# Altium footprint library 691 310 340 0xx.PcbLib: 23 footprints (part 1 of 2)
Each footprint in its own frame and in the unit in brackets; x right, y up, seen from the top. Pads: shape width x height; smd on the part's side, far side on the other; paste and mask are expansions set on the pad; w line width, h text height; cw(c..) or ccw(c..) is an arc to the next point about the centre after c.
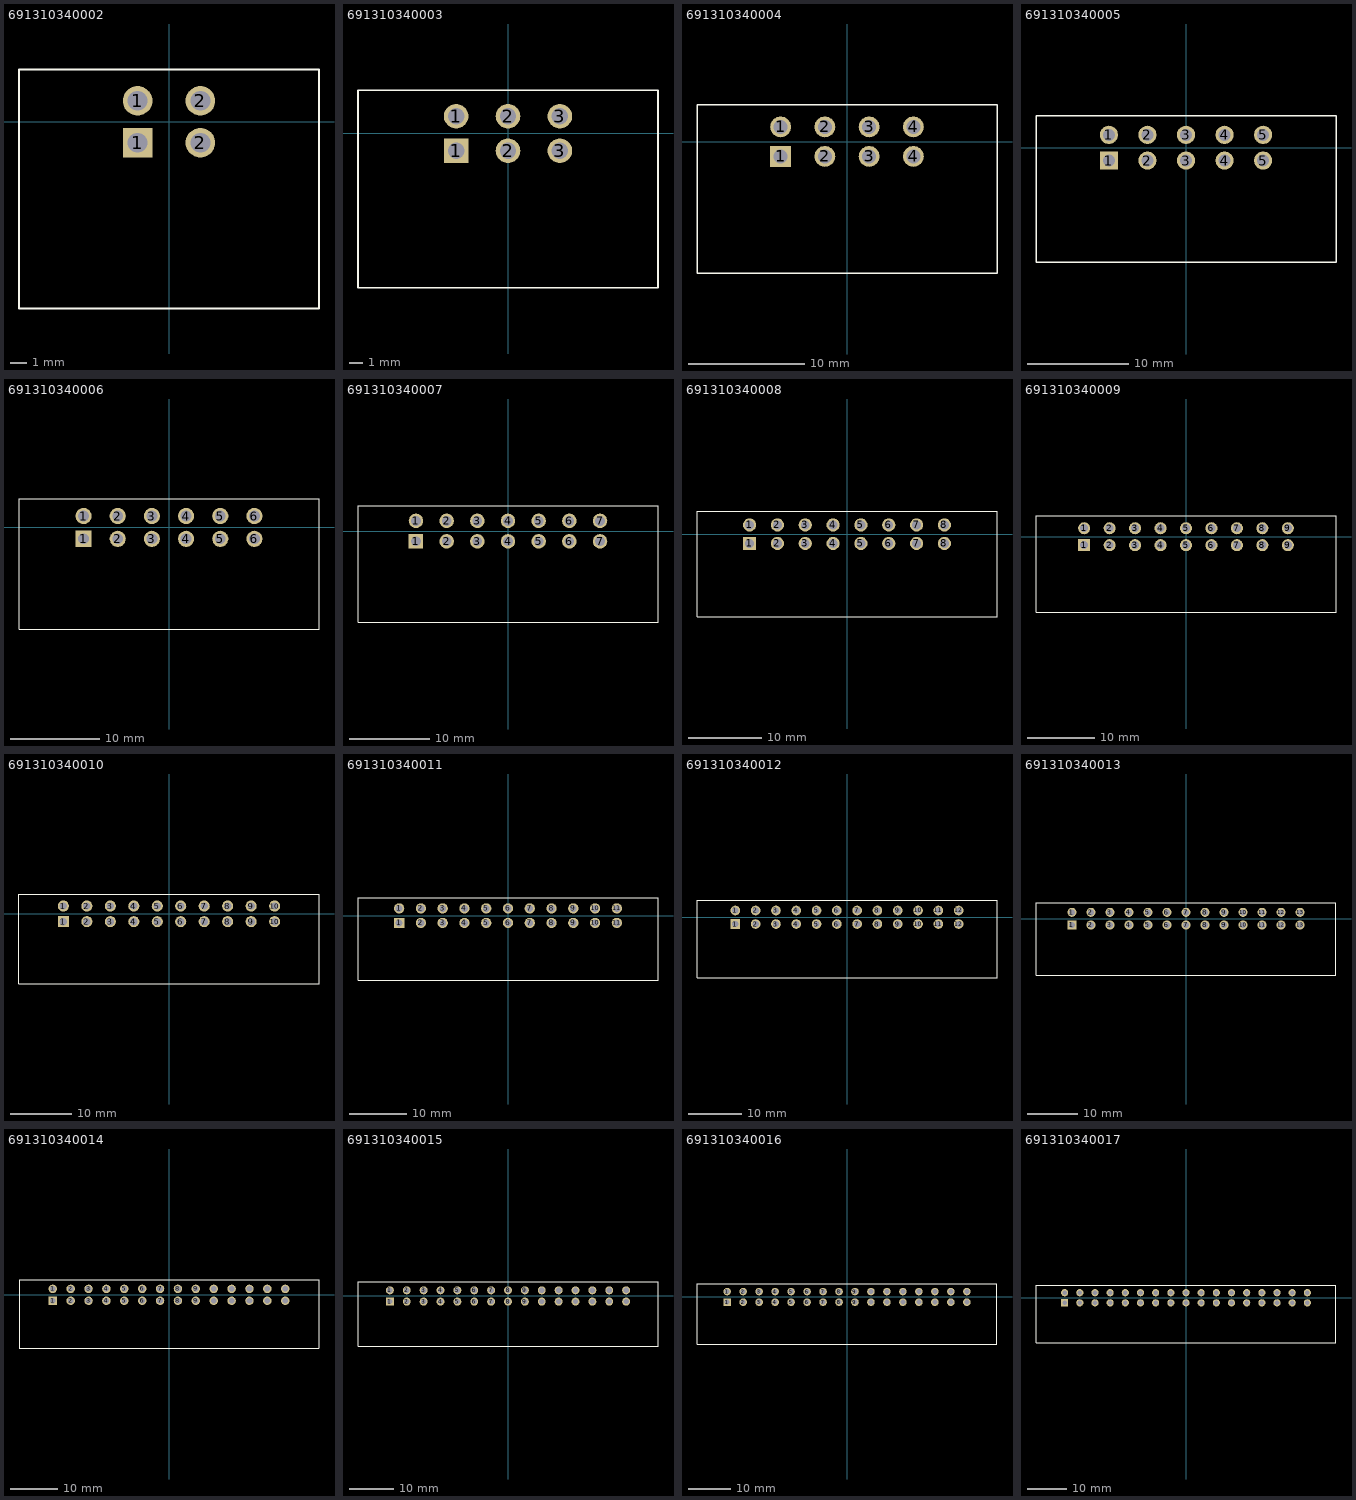
[diagram p0: the footprints below, top view; thin cyan lines are the x and y axes]

## 691310340002 [mm] "Serie 3103 - 3.81 mm _ 2 pins"
height 6.8
pads (4):
  rect 1.8x1.8 hole 1.2: 1(-1.905,-1.27)
  round 1.8 hole 1.2: 1(-1.905,1.27) 2(1.905,-1.27) 2(1.905,1.27)
Top Overlay:
  lines w0.127: -9.105,-11.33 9.105,-11.33 9.105,3.17 -9.105,3.17 -9.105,-11.33
3D body: height 6.9, standoff -3.3, extent -9.105,-11.3 9.105,3.2

## 691310340003 [mm] "Serie 3103 - 3.81 mm _ 3 pins"
height 6.8
pads (6):
  rect 1.8x1.8 hole 1.2: 1(-3.81,-1.27)
  round 1.8 hole 1.2: 1(-3.81,1.27) 2(0,-1.27) 2(0,1.27) 3(3.81,-1.27) 3(3.81,1.27)
Top Overlay:
  lines w0.127: -11.01,-11.33 11.01,-11.33 11.01,3.17 -11.01,3.17 -11.01,-11.33
3D body: height 6.9, standoff -3.3, extent -11,-11.3 11.02,3.2

## 691310340004 [mm] "Serie 3103 - 3.81 mm _ 4 pins"
height 6.8
pads (8):
  rect 1.8x1.8 hole 1.2: 1(-5.715,-1.27)
  round 1.8 hole 1.2: 1(-5.715,1.27) 2(-1.905,-1.27) 2(-1.905,1.27) 3(1.905,-1.27) 3(1.905,1.27) 4(5.715,-1.27) 4(5.715,1.27)
Top Overlay:
  lines w0.127: -12.915,-11.33 12.915,-11.33 12.915,3.17 -12.915,3.17 -12.915,-11.33
3D body: height 6.9, standoff -3.3, extent -12.9,-11.3 12.93,3.2

## 691310340005 [mm] "Serie 3103 - 3.81 mm _ 5 pins"
height 6.8
pads (10):
  rect 1.8x1.8 hole 1.2: 1(-7.62,-1.27)
  round 1.8 hole 1.2: 1(-7.62,1.27) 2(-3.81,-1.27) 2(-3.81,1.27) 3(0,-1.27) 3(0,1.27) 4(3.81,-1.27) 4(3.81,1.27) 5(7.62,-1.27) 5(7.62,1.27)
Top Overlay:
  lines w0.127: -14.82,-11.33 -14.82,3.17 14.82,3.17 14.82,-11.33 -14.82,-11.33
3D body: height 6.9, standoff -3.3, extent -14.8,-11.3 14.84,3.2

## 691310340006 [mm] "Serie 3103 - 3.81 mm _ 6 pins"
height 6.8
pads (12):
  rect 1.8x1.8 hole 1.2: 1(-9.525,-1.27)
  round 1.8 hole 1.2: 1(-9.525,1.27) 2(-5.715,-1.27) 2(-5.715,1.27) 3(-1.905,-1.27) 3(-1.905,1.27) 4(1.905,-1.27) 4(1.905,1.27) 5(5.715,-1.27) 5(5.715,1.27) 6(9.525,-1.27) 6(9.525,1.27)
Top Overlay:
  lines w0.127: -16.725,-11.33 16.725,-11.33 16.725,3.17 -16.725,3.17 -16.725,-11.33
3D body: height 6.9, standoff -3.3, extent -16.7,-11.3 16.75,3.2

## 691310340007 [mm] "Serie 3103 - 3.81 mm _ 7 pins"
height 6.8
pads (14):
  rect 1.8x1.8 hole 1.2: 1(-11.43,-1.27)
  round 1.8 hole 1.2: 1(-11.43,1.27) 2(-7.62,-1.27) 2(-7.62,1.27) 3(-3.81,-1.27) 3(-3.81,1.27) 4(0,-1.27) 4(0,1.27) 5(3.81,-1.27) 5(3.81,1.27) 6(7.62,-1.27) 6(7.62,1.27) 7(11.43,-1.27) 7(11.43,1.27)
Top Overlay:
  lines w0.127: -18.63,-11.33 -18.63,3.17 18.63,3.17 18.63,-11.33 -18.63,-11.33
3D body: height 6.9, standoff -3.3, extent -18.6,-11.3 18.66,3.2

## 691310340008 [mm] "Serie 3103 - 3.81 mm _ 8 pins"
height 6.8
pads (16):
  rect 1.8x1.8 hole 1.2: 1(-13.335,-1.27)
  round 1.8 hole 1.2: 1(-13.335,1.27) 2(-9.525,-1.27) 2(-9.525,1.27) 3(-5.715,-1.27) 3(-5.715,1.27) 4(-1.905,-1.27) 4(-1.905,1.27) 5(1.905,-1.27) 5(1.905,1.27) 6(5.715,-1.27) 6(5.715,1.27) 7(9.525,-1.27) 7(9.525,1.27) 8(13.335,-1.27) 8(13.335,1.27)
Top Overlay:
  lines w0.127: -20.535,-11.33 20.535,-11.33 20.535,3.17 -20.535,3.17 -20.535,-11.33
3D body: height 6.9, standoff -3.3, extent -20.47,-11.4 20.6,3.1

## 691310340009 [mm] "Serie 3103 - 3.81 mm _ 9 pins"
height 6.8
pads (18):
  rect 1.8x1.8 hole 1.2: 1(-15.24,-1.27)
  round 1.8 hole 1.2: 1(-15.24,1.27) 2(-11.43,-1.27) 2(-11.43,1.27) 3(-7.62,-1.27) 3(-7.62,1.27) 4(-3.81,-1.27) 4(-3.81,1.27) 5(0,-1.27) 5(0,1.27) 6(3.81,-1.27) 6(3.81,1.27) 7(7.62,-1.27) 7(7.62,1.27) 8(11.43,-1.27) 8(11.43,1.27) 9(15.24,-1.27) 9(15.24,1.27)
Top Overlay:
  lines w0.127: -22.44,-11.33 22.44,-11.33 22.44,3.17 -22.44,3.17 -22.44,-11.33
3D body: height 6.9, standoff -3.3, extent -22.48,-11.3 22.4,3.2

## 691310340010 [mm] "Serie 3103 - 3.81 mm _ 10 pins"
height 6.8
pads (20):
  rect 1.8x1.8 hole 1.2: 1(-17.145,-1.27)
  round 1.8 hole 1.2: 1(-17.145,1.27) 2(-13.335,-1.27) 2(-13.335,1.27) 3(-9.525,-1.27) 3(-9.525,1.27) 4(-5.715,-1.27) 4(-5.715,1.27) 5(-1.905,-1.27) 5(-1.905,1.27) 6(1.905,-1.27) 6(1.905,1.27) 7(5.715,-1.27) 7(5.715,1.27) 8(9.525,-1.27) 8(9.525,1.27) 9(13.335,-1.27) 9(13.335,1.27) 10(17.145,-1.27) 10(17.145,1.27)
Top Overlay:
  lines w0.127: -24.345,-11.33 24.345,-11.33 24.345,3.17 -24.345,3.17 -24.345,-11.33
3D body: height 6.9, standoff -3.3, extent -24.4,-11.3 24.29,3.2

## 691310340011 [mm] "Serie 3103 - 3.81 mm _ 11 pins"
height 6.8
pads (22):
  rect 1.8x1.8 hole 1.2: 1(-19.05,-1.27)
  round 1.8 hole 1.2: 1(-19.05,1.27) 2(-15.24,-1.27) 2(-15.24,1.27) 3(-11.43,-1.27) 3(-11.43,1.27) 4(-7.62,-1.27) 4(-7.62,1.27) 5(-3.81,-1.27) 5(-3.81,1.27) 6(0,-1.27) 6(0,1.27) 7(3.81,-1.27) 7(3.81,1.27) 8(7.62,-1.27) 8(7.62,1.27) 9(11.43,-1.27) 9(11.43,1.27) 10(15.24,-1.27) 10(15.24,1.27) 11(19.05,-1.27) 11(19.05,1.27)
Top Overlay:
  lines w0.127: -26.25,-11.33 26.25,-11.33 26.25,3.17 -26.25,3.17 -26.25,-11.33
3D body: height 6.9, standoff -3.3, extent -26.3,-11.3 26.2,3.2

## 691310340012 [mm] "Serie 3103 - 3.81 mm _ 12 pins"
height 6.8
pads (24):
  rect 1.8x1.8 hole 1.2: 1(-20.955,-1.27)
  round 1.8 hole 1.2: 1(-20.955,1.27) 2(-17.145,-1.27) 2(-17.145,1.27) 3(-13.335,-1.27) 3(-13.335,1.27) 4(-9.525,-1.27) 4(-9.525,1.27) 5(-5.715,-1.27) 5(-5.715,1.27) 6(-1.905,-1.27) 6(-1.905,1.27) 7(1.905,-1.27) 7(1.905,1.27) 8(5.715,-1.27) 8(5.715,1.27) 9(9.525,-1.27) 9(9.525,1.27) 10(13.335,-1.27) 10(13.335,1.27) 11(17.145,-1.27) 11(17.145,1.27) 12(20.955,-1.27) 12(20.955,1.27)
Top Overlay:
  lines w0.127: -28.155,-11.33 -28.155,3.17 28.155,3.17 28.155,-11.33 -28.155,-11.33
3D body: height 6.9, standoff -3.3, extent -28.1,-11.4 28.21,3.1

## 691310340013 [mm] "Serie 3103 - 3.81 mm _ 13 pins"
height 6.8
pads (26):
  rect 1.8x1.8 hole 1.2: 1(-22.86,-1.27)
  round 1.8 hole 1.2: 1(-22.86,1.27) 2(-19.05,-1.27) 2(-19.05,1.27) 3(-15.24,-1.27) 3(-15.24,1.27) 4(-11.43,-1.27) 4(-11.43,1.27) 5(-7.62,-1.27) 5(-7.62,1.27) 6(-3.81,-1.27) 6(-3.81,1.27) 7(0,-1.27) 7(0,1.27) 8(3.81,-1.27) 8(3.81,1.27) 9(7.62,-1.27) 9(7.62,1.27) 10(11.43,-1.27) 10(11.43,1.27) 11(15.24,-1.27) 11(15.24,1.27) 12(19.05,-1.27) 12(19.05,1.27) 13(22.86,-1.27) 13(22.86,1.27)
Top Overlay:
  lines w0.127: -30.06,-11.33 -30.06,3.17 30.06,3.17 30.06,-11.33 -30.06,-11.33
3D body: height 6.9, standoff -3.3, extent -30.05,-11.35 30.07,3.15

## 691310340014 [mm] "Serie 3103 - 3.81 mm _ 14 pins"
height 6.8
pads (28):
  rect 1.8x1.8 hole 1.2: 1(-24.765,-1.27)
  round 1.8 hole 1.2: 1(-24.765,1.27) 2(-20.955,-1.27) 2(-20.955,1.27) 3(-17.145,-1.27) 3(-17.145,1.27) 4(-13.335,-1.27) 4(-13.335,1.27) 5(-9.525,-1.27) 5(-9.525,1.27) 6(-5.715,-1.27) 6(-5.715,1.27) 7(-1.905,-1.27) 7(-1.905,1.27) 8(1.905,-1.27) 8(1.905,1.27) 9(5.715,-1.27) 9(5.715,1.27) 10(9.525,-1.27) 10(9.525,1.27) 11(13.335,-1.27) 11(13.335,1.27) 12(17.145,-1.27) 12(17.145,1.27) 13(20.955,-1.27) 13(20.955,1.27) 14(24.765,-1.27) 14(24.765,1.27)
Top Overlay:
  lines w0.127: -31.965,-11.33 31.95,-11.33 ; -31.956,-11.33 -31.965,3.17 31.965,3.17 31.965,-11.33
3D body: height 6.9, standoff -3.3, extent -31.98,-11.3 31.95,3.2

## 691310340015 [mm] "Serie 3103 - 3.81 mm _ 15 pins"
height 6.8
pads (30):
  rect 1.8x1.8 hole 1.2: 1(-26.67,-1.27)
  round 1.8 hole 1.2: 1(-26.67,1.27) 2(-22.86,-1.27) 2(-22.86,1.27) 3(-19.05,-1.27) 3(-19.05,1.27) 4(-15.24,-1.27) 4(-15.24,1.27) 5(-11.43,-1.27) 5(-11.43,1.27) 6(-7.62,-1.27) 6(-7.62,1.27) 7(-3.81,-1.27) 7(-3.81,1.27) 8(0,-1.27) 8(0,1.27) 9(3.81,-1.27) 9(3.81,1.27) 10(7.62,-1.27) 10(7.62,1.27) 11(11.43,-1.27) 11(11.43,1.27) 12(15.24,-1.27) 12(15.24,1.27) 13(19.05,-1.27) 13(19.05,1.27) 14(22.86,-1.27) 14(22.86,1.27) 15(26.67,-1.27) 15(26.67,1.27)
Top Overlay:
  lines w0.127: -33.87,-11.33 -33.87,3.17 33.87,3.17 33.87,-11.33 -33.87,-11.33
3D body: height 6.9, standoff -3.3, extent -33.85,-11.3 33.89,3.2

## 691310340016 [mm] "Serie 3103 - 3.81 mm _ 16 pins"
height 6.8
pads (32):
  rect 1.8x1.8 hole 1.2: 1(-28.575,-1.27)
  round 1.8 hole 1.2: 1(-28.575,1.27) 2(-24.765,-1.27) 2(-24.765,1.27) 3(-20.955,-1.27) 3(-20.955,1.27) 4(-17.145,-1.27) 4(-17.145,1.27) 5(-13.335,-1.27) 5(-13.335,1.27) 6(-9.525,-1.27) 6(-9.525,1.27) 7(-5.715,-1.27) 7(-5.715,1.27) 8(-1.905,-1.27) 8(-1.905,1.27) 9(1.905,-1.27) 9(1.905,1.27) 10(5.715,-1.27) 10(5.715,1.27) 11(9.525,-1.27) 11(9.525,1.27) 12(13.335,-1.27) 12(13.335,1.27) 13(17.145,-1.27) 13(17.145,1.27) 14(20.955,-1.27) 14(20.955,1.27) 15(24.765,-1.27) 15(24.765,1.27) 16(28.575,-1.27) 16(28.575,1.27)
Top Overlay:
  lines w0.127: -35.775,-11.33 35.775,-11.33 35.775,3.17 -35.775,3.17 -35.775,-11.33
3D body: height 6.9, standoff -3.3, extent -35.8,-11.35 35.75,3.15

## 691310340017 [mm] "Serie 3103 - 3.81 mm _ 17 pins"
height 6.8
pads (34):
  rect 1.8x1.8 hole 1.2: 1(-30.48,-1.27)
  round 1.8 hole 1.2: 1(-30.48,1.27) 2(-26.67,-1.27) 2(-26.67,1.27) 3(-22.86,-1.27) 3(-22.86,1.27) 4(-19.05,-1.27) 4(-19.05,1.27) 5(-15.24,-1.27) 5(-15.24,1.27) 6(-11.43,-1.27) 6(-11.43,1.27) 7(-7.62,-1.27) 7(-7.62,1.27) 8(-3.81,-1.27) 8(-3.81,1.27) 9(0,-1.27) 9(0,1.27) 10(3.81,-1.27) 10(3.81,1.27) 11(7.62,-1.27) 11(7.62,1.27) 12(11.43,-1.27) 12(11.43,1.27) 13(15.24,-1.27) 13(15.24,1.27) 14(19.05,-1.27) 14(19.05,1.27) 15(22.86,-1.27) 15(22.86,1.27) 16(26.67,-1.27) 16(26.67,1.27) 17(30.48,-1.27) 17(30.48,1.27)
Top Overlay:
  lines w0.127: -37.68,-11.33 37.68,-11.33 37.68,3.17 -37.68,3.17 -37.68,-11.33
3D body: height 6.9, standoff -3.3, extent -37.65,-11.3 37.71,3.2